# Altium footprint library PcbLib_Pin_Headers_part2.PcbLib: 68 footprints (part 3 of 5)
Each footprint in its own frame and in the unit in brackets; x right, y up, seen from the top. Pads: shape width x height; smd on the part's side, far side on the other; paste and mask are expansions set on the pad; w line width, h text height; cw(c..) or ccw(c..) is an arc to the next point about the centre after c.
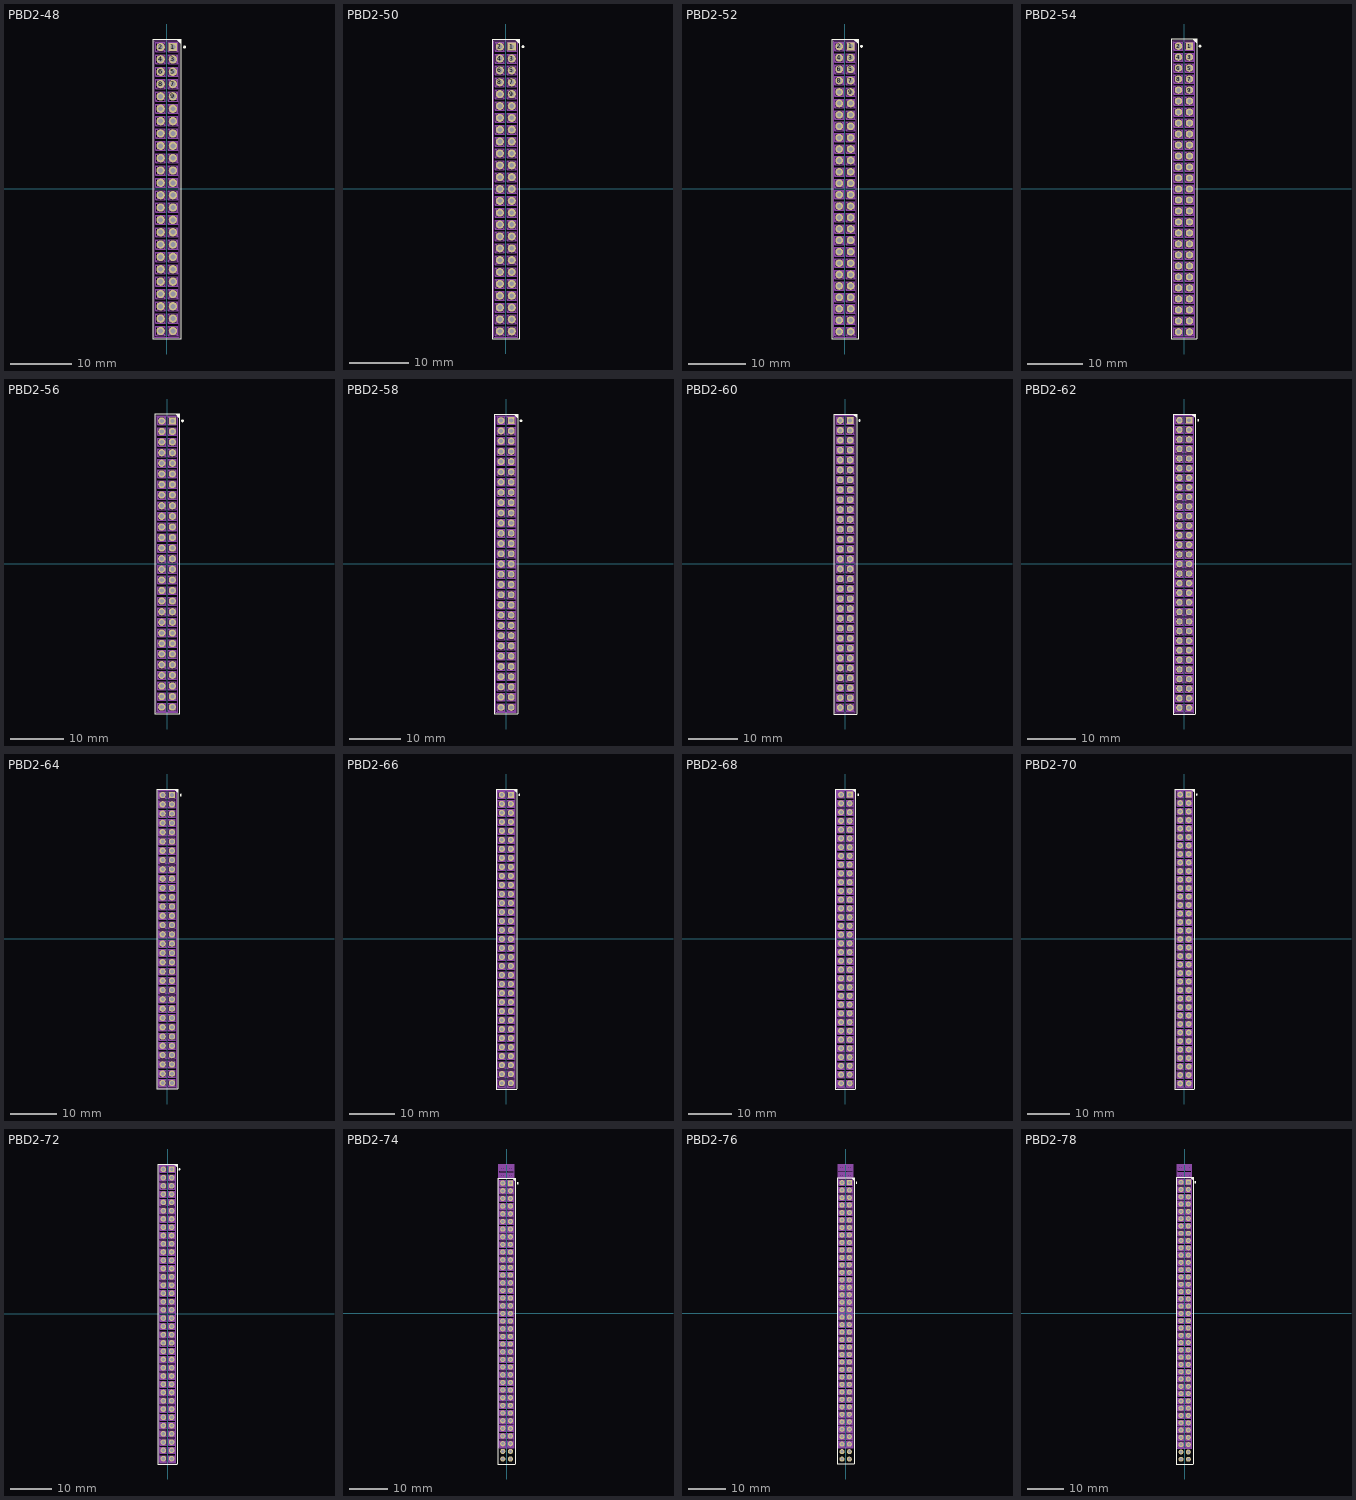
[diagram p2: the footprints below, top view; thin cyan lines are the x and y axes]

## PBD2-48 [mm]
pads (48):
  rect 1.36x1.36 hole 0.8: 1(1,23)
  round 1.36 hole 0.8: 2(-1,23) 3(1,21) 4(-1,21) 5(1,19) 6(-1,19) 7(1,17) 8(-1,17) 9(1,15) 10(-1,15) 11(1,13) 12(-1,13) 13(1,11) 14(-1,11) 15(1,9) 16(-1,9) 17(1,7) 18(-1,7) 19(1,5) 20(-1,5) 21(1,3) 22(-1,3) 23(1,1) 24(-1,1) 25(1,-1) 26(-1,-1) 27(1,-3) 28(-1,-3) 29(1,-5) 30(-1,-5) 31(1,-7) 32(-1,-7) 33(1,-9) 34(-1,-9) 35(1,-11) 36(-1,-11) 37(1,-13) 38(-1,-13) 39(1,-15) 40(-1,-15) 41(1,-17) 42(-1,-17) 43(1,-19) 44(-1,-19) 45(1,-21) 46(-1,-21) 47(1,-23) 48(-1,-23)
Top Overlay:
  circle w0.25: c2.9,23 r0.125
  region: 2.3,23.5 1.5,24.3 2.3,24.3
  lines w0.2: -2.3,-24.3 -2.3,24.3 2.3,24.3 2.3,-24.3 -2.3,-24.3
Top Assy:
  drawing of 1348 lines, arcs and shapes, not listed
  text ".Designator" at 3.92,-3.098 h1.8
3D body "PBD2-48.STEP": height 4.37, standoff -2.63, extent -2,-24 2,24

## PBD2-50 [mm]
pads (50):
  rect 1.36x1.36 hole 0.8: 1(1,24)
  round 1.36 hole 0.8: 2(-1,24) 3(1,22) 4(-1,22) 5(1,20) 6(-1,20) 7(1,18) 8(-1,18) 9(1,16) 10(-1,16) 11(1,14) 12(-1,14) 13(1,12) 14(-1,12) 15(1,10) 16(-1,10) 17(1,8) 18(-1,8) 19(1,6) 20(-1,6) 21(1,4) 22(-1,4) 23(1,2) 24(-1,2) 25(1,0) 26(-1,0) 27(1,-2) 28(-1,-2) 29(1,-4) 30(-1,-4) 31(1,-6) 32(-1,-6) 33(1,-8) 34(-1,-8) 35(1,-10) 36(-1,-10) 37(1,-12) 38(-1,-12) 39(1,-14) 40(-1,-14) 41(1,-16) 42(-1,-16) 43(1,-18) 44(-1,-18) 45(1,-20) 46(-1,-20) 47(1,-22) 48(-1,-22) 49(1,-24) 50(-1,-24)
Top Overlay:
  circle w0.25: c2.9,24 r0.125
  region: 2.3,24.5 1.5,25.3 2.3,25.3
  lines w0.2: -2.3,-25.3 2.3,-25.3 2.3,25.3 -2.3,25.3 -2.3,-25.3
Top Assy:
  drawing of 1404 lines, arcs and shapes, not listed
  text ".Designator" at 3.92,-3.098 h1.8
3D body "PBD2-50.STEP": height 4.37, standoff -2.63, extent -2,-25 2,25

## PBD2-52 [mm]
pads (52):
  rect 1.36x1.36 hole 0.8: 1(1,25)
  round 1.36 hole 0.8: 2(-1,25) 3(1,23) 4(-1,23) 5(1,21) 6(-1,21) 7(1,19) 8(-1,19) 9(1,17) 10(-1,17) 11(1,15) 12(-1,15) 13(1,13) 14(-1,13) 15(1,11) 16(-1,11) 17(1,9) 18(-1,9) 19(1,7) 20(-1,7) 21(1,5) 22(-1,5) 23(1,3) 24(-1,3) 25(1,1) 26(-1,1) 27(1,-1) 28(-1,-1) 29(1,-3) 30(-1,-3) 31(1,-5) 32(-1,-5) 33(1,-7) 34(-1,-7) 35(1,-9) 36(-1,-9) 37(1,-11) 38(-1,-11) 39(1,-13) 40(-1,-13) 41(1,-15) 42(-1,-15) 43(1,-17) 44(-1,-17) 45(1,-19) 46(-1,-19) 47(1,-21) 48(-1,-21) 49(1,-23) 50(-1,-23) 51(1,-25) 52(-1,-25)
Top Overlay:
  circle w0.25: c2.9,25 r0.125
  region: 2.3,25.5 1.5,26.3 2.3,26.3
  lines w0.2: -2.3,-26.3 -2.3,26.3 2.3,26.3 2.3,-26.3 -2.3,-26.3
Top Assy:
  drawing of 1460 lines, arcs and shapes, not listed
  text ".Designator" at 3.92,-3.098 h1.8
3D body "PBD2-52.STEP": height 4.37, standoff -2.63, extent -2,-26 2,26

## PBD2-54 [mm]
pads (54):
  rect 1.36x1.36 hole 0.8: 1(1,26)
  round 1.36 hole 0.8: 2(-1,26) 3(1,24) 4(-1,24) 5(1,22) 6(-1,22) 7(1,20) 8(-1,20) 9(1,18) 10(-1,18) 11(1,16) 12(-1,16) 13(1,14) 14(-1,14) 15(1,12) 16(-1,12) 17(1,10) 18(-1,10) 19(1,8) 20(-1,8) 21(1,6) 22(-1,6) 23(1,4) 24(-1,4) 25(1,2) 26(-1,2) 27(1,0) 28(-1,0) 29(1,-2) 30(-1,-2) 31(1,-4) 32(-1,-4) 33(1,-6) 34(-1,-6) 35(1,-8) 36(-1,-8) 37(1,-10) 38(-1,-10) 39(1,-12) 40(-1,-12) 41(1,-14) 42(-1,-14) 43(1,-16) 44(-1,-16) 45(1,-18) 46(-1,-18) 47(1,-20) 48(-1,-20) 49(1,-22) 50(-1,-22) 51(1,-24) 52(-1,-24) 53(1,-26) 54(-1,-26)
Top Overlay:
  circle w0.25: c2.9,26 r0.125
  region: 2.3,26.5 1.5,27.3 2.3,27.3
  lines w0.2: -2.3,-27.3 2.3,-27.3 2.3,27.3 -2.3,27.3 -2.3,-27.3
Top Assy:
  drawing of 1516 lines, arcs and shapes, not listed
  text ".Designator" at 3.92,-3.098 h1.8
3D body "PBD2-54.STEP": height 4.37, standoff -2.63, extent -2,-27 2,27

## PBD2-56 [mm]
pads (56):
  rect 1.36x1.36 hole 0.8: 1(1,27)
  round 1.36 hole 0.8: 2(-1,27) 3(1,25) 4(-1,25) 5(1,23) 6(-1,23) 7(1,21) 8(-1,21) 9(1,19) 10(-1,19) 11(1,17) 12(-1,17) 13(1,15) 14(-1,15) 15(1,13) 16(-1,13) 17(1,11) 18(-1,11) 19(1,9) 20(-1,9) 21(1,7) 22(-1,7) 23(1,5) 24(-1,5) 25(1,3) 26(-1,3) 27(1,1) 28(-1,1) 29(1,-1) 30(-1,-1) 31(1,-3) 32(-1,-3) 33(1,-5) 34(-1,-5) 35(1,-7) 36(-1,-7) 37(1,-9) 38(-1,-9) 39(1,-11) 40(-1,-11) 41(1,-13) 42(-1,-13) 43(1,-15) 44(-1,-15) 45(1,-17) 46(-1,-17) 47(1,-19) 48(-1,-19) 49(1,-21) 50(-1,-21) 51(1,-23) 52(-1,-23) 53(1,-25) 54(-1,-25) 55(1,-27) 56(-1,-27)
Top Overlay:
  circle w0.25: c2.9,27 r0.125
  region: 2.3,27.5 1.5,28.3 2.3,28.3
  lines w0.2: -2.3,-28.3 2.3,-28.3 2.3,28.3 -2.3,28.3 -2.3,-28.3
Top Assy:
  drawing of 1572 lines, arcs and shapes, not listed
  text ".Designator" at 3.92,-3.098 h1.8
3D body "PBD2-56.STEP": height 4.37, standoff -2.63, extent -2,-28 2,28

## PBD2-58 [mm]
pads (58):
  rect 1.36x1.36 hole 0.8: 1(1,28)
  round 1.36 hole 0.8: 2(-1,28) 3(1,26) 4(-1,26) 5(1,24) 6(-1,24) 7(1,22) 8(-1,22) 9(1,20) 10(-1,20) 11(1,18) 12(-1,18) 13(1,16) 14(-1,16) 15(1,14) 16(-1,14) 17(1,12) 18(-1,12) 19(1,10) 20(-1,10) 21(1,8) 22(-1,8) 23(1,6) 24(-1,6) 25(1,4) 26(-1,4) 27(1,2) 28(-1,2) 29(1,0) 30(-1,0) 31(1,-2) 32(-1,-2) 33(1,-4) 34(-1,-4) 35(1,-6) 36(-1,-6) 37(1,-8) 38(-1,-8) 39(1,-10) 40(-1,-10) 41(1,-12) 42(-1,-12) 43(1,-14) 44(-1,-14) 45(1,-16) 46(-1,-16) 47(1,-18) 48(-1,-18) 49(1,-20) 50(-1,-20) 51(1,-22) 52(-1,-22) 53(1,-24) 54(-1,-24) 55(1,-26) 56(-1,-26) 57(1,-28) 58(-1,-28)
Top Overlay:
  circle w0.25: c2.9,28 r0.125
  region: 2.3,28.5 1.5,29.3 2.3,29.3
  lines w0.2: -2.3,-29.3 -2.3,29.3 2.3,29.3 2.3,-29.3 -2.3,-29.3
Top Assy:
  drawing of 1628 lines, arcs and shapes, not listed
  text ".Designator" at 3.92,-3.098 h1.8
3D body "PBD2-58.STEP": height 4.37, standoff -2.63, extent -2,-29 2,29

## PBD2-60 [mm]
pads (60):
  rect 1.36x1.36 hole 0.8: 1(1,29)
  round 1.36 hole 0.8: 2(-1,29) 3(1,27) 4(-1,27) 5(1,25) 6(-1,25) 7(1,23) 8(-1,23) 9(1,21) 10(-1,21) 11(1,19) 12(-1,19) 13(1,17) 14(-1,17) 15(1,15) 16(-1,15) 17(1,13) 18(-1,13) 19(1,11) 20(-1,11) 21(1,9) 22(-1,9) 23(1,7) 24(-1,7) 25(1,5) 26(-1,5) 27(1,3) 28(-1,3) 29(1,1) 30(-1,1) 31(1,-1) 32(-1,-1) 33(1,-3) 34(-1,-3) 35(1,-5) 36(-1,-5) 37(1,-7) 38(-1,-7) 39(1,-9) 40(-1,-9) 41(1,-11) 42(-1,-11) 43(1,-13) 44(-1,-13) 45(1,-15) 46(-1,-15) 47(1,-17) 48(-1,-17) 49(1,-19) 50(-1,-19) 51(1,-21) 52(-1,-21) 53(1,-23) 54(-1,-23) 55(1,-25) 56(-1,-25) 57(1,-27) 58(-1,-27) 59(1,-29) 60(-1,-29)
Top Overlay:
  circle w0.25: c2.9,29 r0.125
  region: 2.3,29.5 1.5,30.3 2.3,30.3
  lines w0.2: -2.3,-30.3 -2.3,30.3 2.3,30.3 2.3,-30.3 -2.3,-30.3
Top Assy:
  drawing of 1684 lines, arcs and shapes, not listed
  text ".Designator" at 3.92,-3.098 h1.8
3D body "PBD2-60.STEP": height 4.37, standoff -2.63, extent -2,-30 2,30

## PBD2-62 [mm]
pads (62):
  rect 1.36x1.36 hole 0.8: 1(1,30)
  round 1.36 hole 0.8: 2(-1,30) 3(1,28) 4(-1,28) 5(1,26) 6(-1,26) 7(1,24) 8(-1,24) 9(1,22) 10(-1,22) 11(1,20) 12(-1,20) 13(1,18) 14(-1,18) 15(1,16) 16(-1,16) 17(1,14) 18(-1,14) 19(1,12) 20(-1,12) 21(1,10) 22(-1,10) 23(1,8) 24(-1,8) 25(1,6) 26(-1,6) 27(1,4) 28(-1,4) 29(1,2) 30(-1,2) 31(1,0) 32(-1,0) 33(1,-2) 34(-1,-2) 35(1,-4) 36(-1,-4) 37(1,-6) 38(-1,-6) 39(1,-8) 40(-1,-8) 41(1,-10) 42(-1,-10) 43(1,-12) 44(-1,-12) 45(1,-14) 46(-1,-14) 47(1,-16) 48(-1,-16) 49(1,-18) 50(-1,-18) 51(1,-20) 52(-1,-20) 53(1,-22) 54(-1,-22) 55(1,-24) 56(-1,-24) 57(1,-26) 58(-1,-26) 59(1,-28) 60(-1,-28) 61(1,-30) 62(-1,-30)
Top Overlay:
  circle w0.25: c2.9,30 r0.125
  region: 2.3,30.5 1.5,31.3 2.3,31.3
  lines w0.2: -2.3,-31.3 2.3,-31.3 2.3,31.3 -2.3,31.3 -2.3,-31.3
Top Assy:
  drawing of 1740 lines, arcs and shapes, not listed
  text ".Designator" at 3.92,-3.098 h1.8
3D body "PBD2-62.STEP": height 4.37, standoff -2.63, extent -2,-31 2,31

## PBD2-64 [mm]
pads (64):
  rect 1.36x1.36 hole 0.8: 1(1,31)
  round 1.36 hole 0.8: 2(-1,31) 3(1,29) 4(-1,29) 5(1,27) 6(-1,27) 7(1,25) 8(-1,25) 9(1,23) 10(-1,23) 11(1,21) 12(-1,21) 13(1,19) 14(-1,19) 15(1,17) 16(-1,17) 17(1,15) 18(-1,15) 19(1,13) 20(-1,13) 21(1,11) 22(-1,11) 23(1,9) 24(-1,9) 25(1,7) 26(-1,7) 27(1,5) 28(-1,5) 29(1,3) 30(-1,3) 31(1,1) 32(-1,1) 33(1,-1) 34(-1,-1) 35(1,-3) 36(-1,-3) 37(1,-5) 38(-1,-5) 39(1,-7) 40(-1,-7) 41(1,-9) 42(-1,-9) 43(1,-11) 44(-1,-11) 45(1,-13) 46(-1,-13) 47(1,-15) 48(-1,-15) 49(1,-17) 50(-1,-17) 51(1,-19) 52(-1,-19) 53(1,-21) 54(-1,-21) 55(1,-23) 56(-1,-23) 57(1,-25) 58(-1,-25) 59(1,-27) 60(-1,-27) 61(1,-29) 62(-1,-29) 63(1,-31) 64(-1,-31)
Top Overlay:
  circle w0.25: c2.9,31 r0.125
  region: 2.3,31.5 1.5,32.3 2.3,32.3
  lines w0.2: -2.3,-32.3 2.3,-32.3 2.3,32.3 -2.3,32.3 -2.3,-32.3
Top Assy:
  drawing of 1796 lines, arcs and shapes, not listed
  text ".Designator" at 3.92,-3.098 h1.8
3D body "PBD2-64.STEP": height 4.37, standoff -2.63, extent -2,-32 2,32

## PBD2-66 [mm]
pads (66):
  rect 1.36x1.36 hole 0.8: 1(1,32)
  round 1.36 hole 0.8: 2(-1,32) 3(1,30) 4(-1,30) 5(1,28) 6(-1,28) 7(1,26) 8(-1,26) 9(1,24) 10(-1,24) 11(1,22) 12(-1,22) 13(1,20) 14(-1,20) 15(1,18) 16(-1,18) 17(1,16) 18(-1,16) 19(1,14) 20(-1,14) 21(1,12) 22(-1,12) 23(1,10) 24(-1,10) 25(1,8) 26(-1,8) 27(1,6) 28(-1,6) 29(1,4) 30(-1,4) 31(1,2) 32(-1,2) 33(1,0) 34(-1,0) 35(1,-2) 36(-1,-2) 37(1,-4) 38(-1,-4) 39(1,-6) 40(-1,-6) 41(1,-8) 42(-1,-8) 43(1,-10) 44(-1,-10) 45(1,-12) 46(-1,-12) 47(1,-14) 48(-1,-14) 49(1,-16) 50(-1,-16) 51(1,-18) 52(-1,-18) 53(1,-20) 54(-1,-20) 55(1,-22) 56(-1,-22) 57(1,-24) 58(-1,-24) 59(1,-26) 60(-1,-26) 61(1,-28) 62(-1,-28) 63(1,-30) 64(-1,-30) 65(1,-32) 66(-1,-32)
Top Overlay:
  circle w0.25: c2.9,32 r0.125
  region: 2.3,32.5 1.5,33.3 2.3,33.3
  lines w0.2: -2.3,-33.3 2.3,-33.3 2.3,33.3 -2.3,33.3 -2.3,-33.3
Top Assy:
  drawing of 1852 lines, arcs and shapes, not listed
  text ".Designator" at 3.92,-3.098 h1.8
3D body "PBD2-66.STEP": height 4.37, standoff -2.63, extent -2,-33 2,33

## PBD2-68 [mm]
pads (68):
  rect 1.36x1.36 hole 0.8: 1(1,33)
  round 1.36 hole 0.8: 2(-1,33) 3(1,31) 4(-1,31) 5(1,29) 6(-1,29) 7(1,27) 8(-1,27) 9(1,25) 10(-1,25) 11(1,23) 12(-1,23) 13(1,21) 14(-1,21) 15(1,19) 16(-1,19) 17(1,17) 18(-1,17) 19(1,15) 20(-1,15) 21(1,13) 22(-1,13) 23(1,11) 24(-1,11) 25(1,9) 26(-1,9) 27(1,7) 28(-1,7) 29(1,5) 30(-1,5) 31(1,3) 32(-1,3) 33(1,1) 34(-1,1) 35(1,-1) 36(-1,-1) 37(1,-3) 38(-1,-3) 39(1,-5) 40(-1,-5) 41(1,-7) 42(-1,-7) 43(1,-9) 44(-1,-9) 45(1,-11) 46(-1,-11) 47(1,-13) 48(-1,-13) 49(1,-15) 50(-1,-15) 51(1,-17) 52(-1,-17) 53(1,-19) 54(-1,-19) 55(1,-21) 56(-1,-21) 57(1,-23) 58(-1,-23) 59(1,-25) 60(-1,-25) 61(1,-27) 62(-1,-27) 63(1,-29) 64(-1,-29) 65(1,-31) 66(-1,-31) 67(1,-33) 68(-1,-33)
Top Overlay:
  circle w0.25: c2.9,33 r0.125
  region: 2.3,33.5 1.5,34.3 2.3,34.3
  lines w0.2: -2.3,-34.3 2.3,-34.3 2.3,34.3 -2.3,34.3 -2.3,-34.3
Top Assy:
  drawing of 1908 lines, arcs and shapes, not listed
  text ".Designator" at 3.92,-3.098 h1.8
3D body "PBD2-68.STEP": height 4.37, standoff -2.63, extent -2,-34 2,34

## PBD2-70 [mm]
pads (70):
  rect 1.36x1.36 hole 0.8: 1(1,34)
  round 1.36 hole 0.8: 2(-1,34) 3(1,32) 4(-1,32) 5(1,30) 6(-1,30) 7(1,28) 8(-1,28) 9(1,26) 10(-1,26) 11(1,24) 12(-1,24) 13(1,22) 14(-1,22) 15(1,20) 16(-1,20) 17(1,18) 18(-1,18) 19(1,16) 20(-1,16) 21(1,14) 22(-1,14) 23(1,12) 24(-1,12) 25(1,10) 26(-1,10) 27(1,8) 28(-1,8) 29(1,6) 30(-1,6) 31(1,4) 32(-1,4) 33(1,2) 34(-1,2) 35(1,0) 36(-1,0) 37(1,-2) 38(-1,-2) 39(1,-4) 40(-1,-4) 41(1,-6) 42(-1,-6) 43(1,-8) 44(-1,-8) 45(1,-10) 46(-1,-10) 47(1,-12) 48(-1,-12) 49(1,-14) 50(-1,-14) 51(1,-16) 52(-1,-16) 53(1,-18) 54(-1,-18) 55(1,-20) 56(-1,-20) 57(1,-22) 58(-1,-22) 59(1,-24) 60(-1,-24) 61(1,-26) 62(-1,-26) 63(1,-28) 64(-1,-28) 65(1,-30) 66(-1,-30) 67(1,-32) 68(-1,-32) 69(1,-34) 70(-1,-34)
Top Overlay:
  circle w0.25: c2.9,34 r0.125
  region: 2.3,34.5 1.5,35.3 2.3,35.3
  lines w0.2: -2.3,-35.3 -2.3,35.3 2.3,35.3 2.3,-35.3 -2.3,-35.3
Top Assy:
  drawing of 1964 lines, arcs and shapes, not listed
  text ".Designator" at 3.92,-3.098 h1.8
3D body "PBD2-70.STEP": height 4.37, standoff -2.63, extent -2,-35 2,35

## PBD2-72 [mm]
pads (72):
  rect 1.36x1.36 hole 0.8: 1(1,35)
  round 1.36 hole 0.8: 2(-1,35) 3(1,33) 4(-1,33) 5(1,31) 6(-1,31) 7(1,29) 8(-1,29) 9(1,27) 10(-1,27) 11(1,25) 12(-1,25) 13(1,23) 14(-1,23) 15(1,21) 16(-1,21) 17(1,19) 18(-1,19) 19(1,17) 20(-1,17) 21(1,15) 22(-1,15) 23(1,13) 24(-1,13) 25(1,11) 26(-1,11) 27(1,9) 28(-1,9) 29(1,7) 30(-1,7) 31(1,5) 32(-1,5) 33(1,3) 34(-1,3) 35(1,1) 36(-1,1) 37(1,-1) 38(-1,-1) 39(1,-3) 40(-1,-3) 41(1,-5) 42(-1,-5) 43(1,-7) 44(-1,-7) 45(1,-9) 46(-1,-9) 47(1,-11) 48(-1,-11) 49(1,-13) 50(-1,-13) 51(1,-15) 52(-1,-15) 53(1,-17) 54(-1,-17) 55(1,-19) 56(-1,-19) 57(1,-21) 58(-1,-21) 59(1,-23) 60(-1,-23) 61(1,-25) 62(-1,-25) 63(1,-27) 64(-1,-27) 65(1,-29) 66(-1,-29) 67(1,-31) 68(-1,-31) 69(1,-33) 70(-1,-33) 71(1,-35) 72(-1,-35)
Top Overlay:
  circle w0.25: c2.9,35 r0.125
  region: 2.3,35.5 1.5,36.3 2.3,36.3
  lines w0.2: 2.3,-36.3 2.3,36.3 -2.3,36.3 -2.3,-36.3 2.3,-36.3 ; 2.3,-36.3 2.3,-36.3
Top Assy:
  drawing of 2020 lines, arcs and shapes, not listed
  text ".Designator" at 3.92,-3.098 h1.8
3D body "PBD2-72.STEP": height 4.37, standoff -2.63, extent -2,-36 2,36

## PBD2-74 [mm]
pads (74):
  rect 1.36x1.36 hole 0.8: 1(1,34)
  round 1.36 hole 0.8: 2(-1,34) 3(1,32) 4(-1,32) 5(1,30) 6(-1,30) 7(1,28) 8(-1,28) 9(1,26) 10(-1,26) 11(1,24) 12(-1,24) 13(1,22) 14(-1,22) 15(1,20) 16(-1,20) 17(1,18) 18(-1,18) 19(1,16) 20(-1,16) 21(1,14) 22(-1,14) 23(1,12) 24(-1,12) 25(1,10) 26(-1,10) 27(1,8) 28(-1,8) 29(1,6) 30(-1,6) 31(1,4) 32(-1,4) 33(1,2) 34(-1,2) 35(1,0) 36(-1,0) 37(1,-2) 38(-1,-2) 39(1,-4) 40(-1,-4) 41(1,-6) 42(-1,-6) 43(1,-8) 44(-1,-8) 45(1,-10) 46(-1,-10) 47(1,-12) 48(-1,-12) 49(1,-14) 50(-1,-14) 51(1,-16) 52(-1,-16) 53(1,-18) 54(-1,-18) 55(1,-20) 56(-1,-20) 57(1,-22) 58(-1,-22) 59(1,-24) 60(-1,-24) 61(1,-26) 62(-1,-26) 63(1,-28) 64(-1,-28) 65(1,-30) 66(-1,-30) 67(1,-32) 68(-1,-32) 69(1,-34) 70(-1,-34) 71(1,-36) 72(-1,-36) 73(1,-38) 74(-1,-38)
Top Overlay:
  circle w0.25: c2.9,34 r0.125
  region: 2.3,34.5 1.5,35.3 2.3,35.3
  lines w0.2: -2.3,-39.3 2.3,-39.3 2.3,35.3 -2.3,35.3 -2.3,-39.3
Top Assy:
  drawing of 2076 lines, arcs and shapes, not listed
  text ".Designator" at 3.92,-3.098 h1.8
3D body "PBD2-74.STEP": height 4.37, standoff -2.63, extent -2,-35 2,39

## PBD2-76 [mm]
pads (76):
  rect 1.36x1.36 hole 0.8: 1(1,35)
  round 1.36 hole 0.8: 2(-1,35) 3(1,33) 4(-1,33) 5(1,31) 6(-1,31) 7(1,29) 8(-1,29) 9(1,27) 10(-1,27) 11(1,25) 12(-1,25) 13(1,23) 14(-1,23) 15(1,21) 16(-1,21) 17(1,19) 18(-1,19) 19(1,17) 20(-1,17) 21(1,15) 22(-1,15) 23(1,13) 24(-1,13) 25(1,11) 26(-1,11) 27(1,9) 28(-1,9) 29(1,7) 30(-1,7) 31(1,5) 32(-1,5) 33(1,3) 34(-1,3) 35(1,1) 36(-1,1) 37(1,-1) 38(-1,-1) 39(1,-3) 40(-1,-3) 41(1,-5) 42(-1,-5) 43(1,-7) 44(-1,-7) 45(1,-9) 46(-1,-9) 47(1,-11) 48(-1,-11) 49(1,-13) 50(-1,-13) 51(1,-15) 52(-1,-15) 53(1,-17) 54(-1,-17) 55(1,-19) 56(-1,-19) 57(1,-21) 58(-1,-21) 59(1,-23) 60(-1,-23) 61(1,-25) 62(-1,-25) 63(1,-27) 64(-1,-27) 65(1,-29) 66(-1,-29) 67(1,-31) 68(-1,-31) 69(1,-33) 70(-1,-33) 71(1,-35) 72(-1,-35) 73(1,-37) 74(-1,-37) 75(1,-39) 76(-1,-39)
Top Overlay:
  circle w0.25: c2.9,35 r0.125
  region: 2.3,35.5 1.5,36.3 2.3,36.3
  lines w0.2: -2.3,-40.3 -2.3,36.3 2.3,36.3 2.3,-40.3 -2.3,-40.3
Top Assy:
  drawing of 2132 lines, arcs and shapes, not listed
  text ".Designator" at 3.92,-3.098 h1.8
3D body "PBD2-76.STEP": height 4.37, standoff -2.63, extent -2,-36 2,40

## PBD2-78 [mm]
pads (78):
  rect 1.36x1.36 hole 0.8: 1(1,36)
  round 1.36 hole 0.8: 2(-1,36) 3(1,34) 4(-1,34) 5(1,32) 6(-1,32) 7(1,30) 8(-1,30) 9(1,28) 10(-1,28) 11(1,26) 12(-1,26) 13(1,24) 14(-1,24) 15(1,22) 16(-1,22) 17(1,20) 18(-1,20) 19(1,18) 20(-1,18) 21(1,16) 22(-1,16) 23(1,14) 24(-1,14) 25(1,12) 26(-1,12) 27(1,10) 28(-1,10) 29(1,8) 30(-1,8) 31(1,6) 32(-1,6) 33(1,4) 34(-1,4) 35(1,2) 36(-1,2) 37(1,0) 38(-1,0) 39(1,-2) 40(-1,-2) 41(1,-4) 42(-1,-4) 43(1,-6) 44(-1,-6) 45(1,-8) 46(-1,-8) 47(1,-10) 48(-1,-10) 49(1,-12) 50(-1,-12) 51(1,-14) 52(-1,-14) 53(1,-16) 54(-1,-16) 55(1,-18) 56(-1,-18) 57(1,-20) 58(-1,-20) 59(1,-22) 60(-1,-22) 61(1,-24) 62(-1,-24) 63(1,-26) 64(-1,-26) 65(1,-28) 66(-1,-28) 67(1,-30) 68(-1,-30) 69(1,-32) 70(-1,-32) 71(1,-34) 72(-1,-34) 73(1,-36) 74(-1,-36) 75(1,-38) 76(-1,-38) 77(1,-40) 78(-1,-40)
Top Overlay:
  circle w0.25: c2.9,36 r0.125
  region: 2.3,36.5 1.5,37.3 2.3,37.3
  lines w0.2: -2.3,-41.3 2.3,-41.3 2.3,37.3 -2.3,37.3 -2.3,-41.3
Top Assy:
  drawing of 2188 lines, arcs and shapes, not listed
  text ".Designator" at 3.92,-3.098 h1.8
3D body "PBD2-78.STEP": height 4.37, standoff -2.63, extent -2,-37 2,41